# Altium footprint library ESKDPcbLib.PcbLib: 608 footprints (part 33 of 38)
Each footprint in its own frame and in the unit in brackets; x right, y up, seen from the top. Pads: shape width x height; smd on the part's side, far side on the other; paste and mask are expansions set on the pad; w line width, h text height; cw(c..) or ccw(c..) is an arc to the next point about the centre after c.
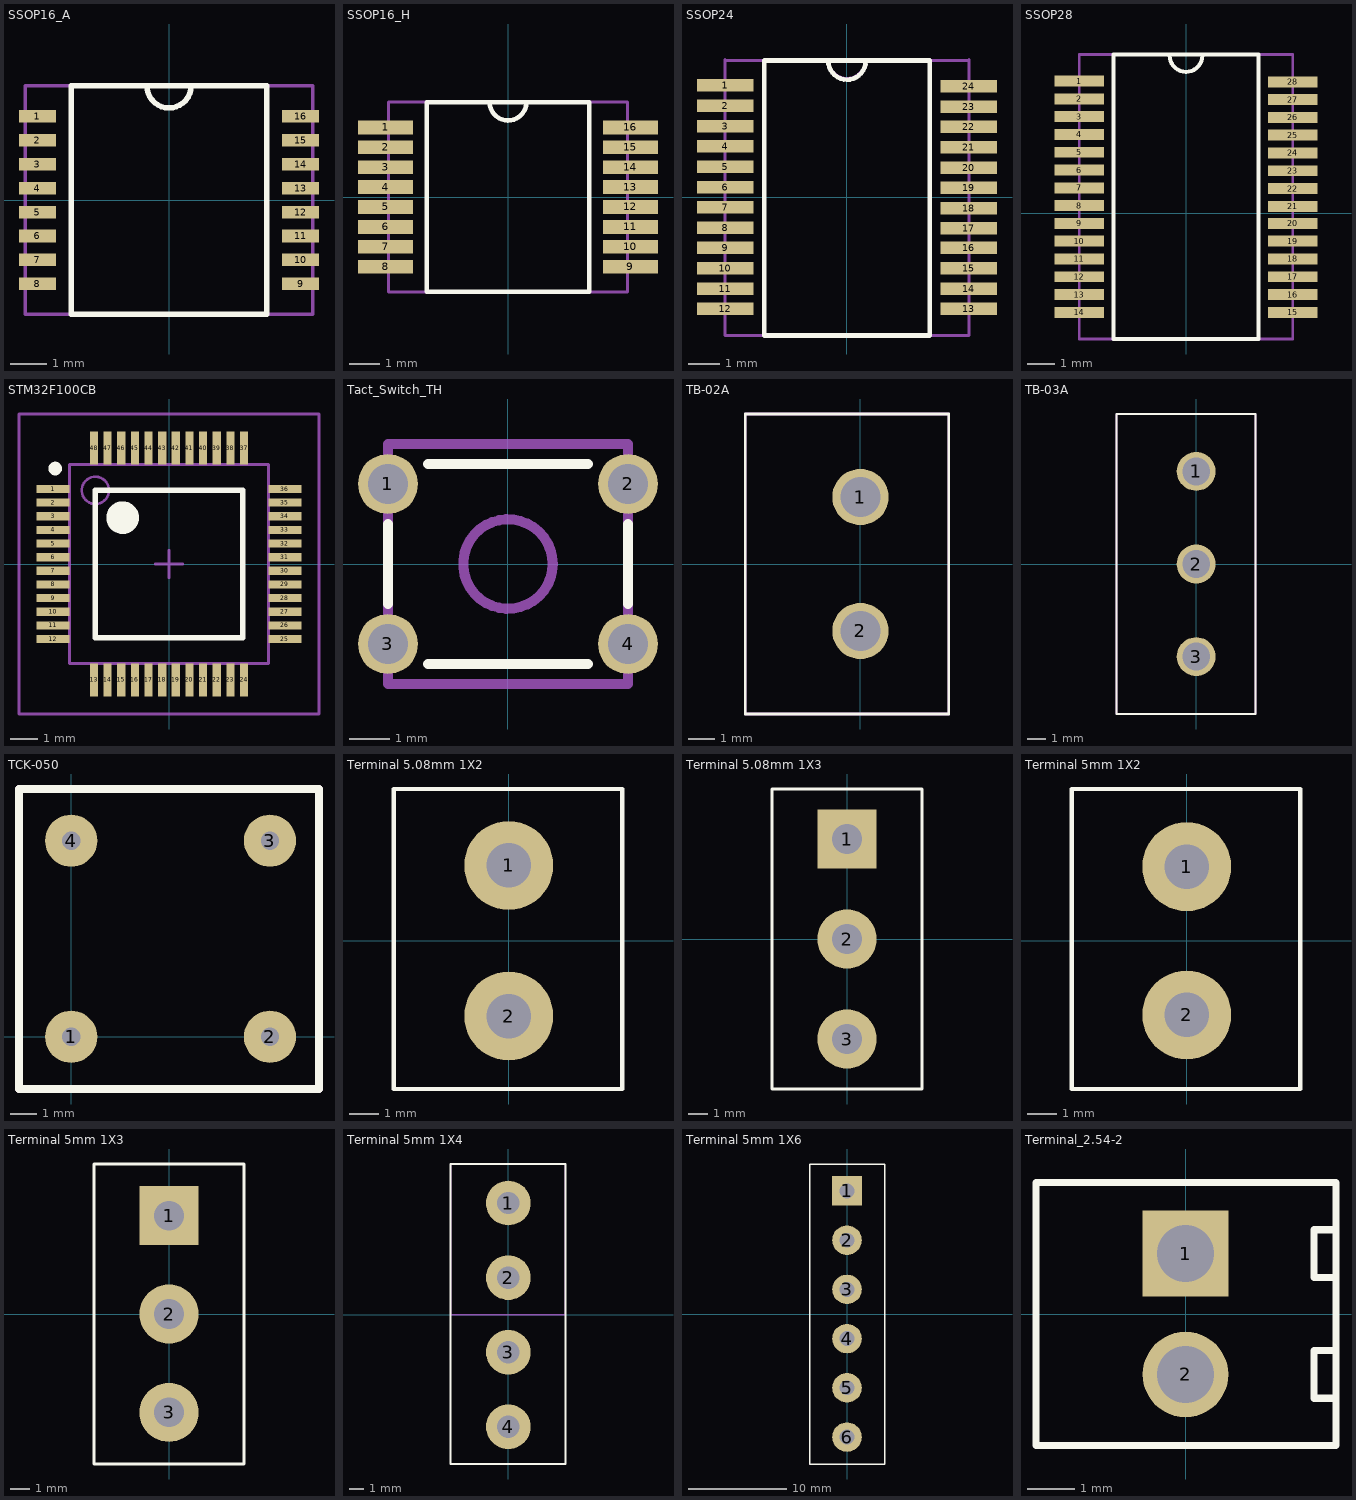
[diagram p32: the footprints below, top view; thin cyan lines are the x and y axes]

## SSOP16_A [mm]
height 1.99
pads (16):
  rect 1x0.34 smd: 1(-3.57,2.275) 2(-3.57,1.625) 3(-3.57,0.975) 4(-3.57,0.325) 5(-3.57,-0.325) 6(-3.57,-0.975) 7(-3.57,-1.625) 8(-3.57,-2.275) 9(3.57,-2.275) 10(3.57,-1.625) 11(3.57,-0.975) 12(3.57,-0.325) 13(3.57,0.325) 14(3.57,0.975) 15(3.57,1.625) 16(3.57,2.275)
Top Overlay:
  lines w0.15: -0.6,3.1 ccw(c0,3.1) 0.6,3.09 ; -2.65,-3.1 2.65,-3.1 2.65,3.1 -2.65,3.1 -2.65,-3.1
Mechanical 7:
  lines w0.1: -2.65,-3.1 -2.65,3.1 ; -0.6,3.1 ccw(c0,3.1) 0.6,3.09 ; 2.65,-3.1 2.65,3.1 ; -3.9,-3.1 -3.9,3.1 3.9,3.1 3.9,-3.1 -3.9,-3.1
Mechanical 10:
  text ".Comment" at -1.02,-3.71 h0.6
  text ".Designator" at -1.23,3.46 h0.8
3D body: height 0.75, standoff 0, extent 2.65,-3.1 3.9,3.1
3D body: height 0.75, standoff 0, extent -3.9,-3.1 -2.65,3.1
3D body: height 1.99, standoff 0, extent -2.65,-3.1 2.65,3.1

## SSOP16_H [mm]
height 1.99
pads (16):
  rect 1.8x0.45 smd: 1(-4,2.275) 2(-4,1.625) 3(-4,0.975) 4(-4,0.325) 5(-4,-0.325) 6(-4,-0.975) 7(-4,-1.625) 8(-4,-2.275) 9(4,-2.275) 10(4,-1.625) 11(4,-0.975) 12(4,-0.325) 13(4,0.325) 14(4,0.975) 15(4,1.625) 16(4,2.275)
Top Overlay:
  lines w0.15: -0.6,3.1 ccw(c0,3.1) 0.6,3.09 ; -2.65,-3.1 2.65,-3.1 2.65,3.1 -2.65,3.1 -2.65,-3.1
Mechanical 7:
  lines w0.1: -2.65,-3.1 -2.65,3.1 ; -0.6,3.1 ccw(c0,3.1) 0.6,3.09 ; 2.65,-3.1 2.65,3.1 ; -3.9,-3.1 3.9,-3.1 3.9,3.1 -3.9,3.1 -3.9,-3.1
Mechanical 10:
  text ".Comment" at -0.67,-3.72 h0.6
  text ".Designator" at -1.23,3.46 h0.8
3D body: height 0.75, standoff 0, extent 2.65,-3.1 3.9,3.1
3D body: height 0.75, standoff 0, extent -3.9,-3.1 -2.65,3.1
3D body: height 1.99, standoff 0, extent -2.65,-3.1 2.65,3.1

## SSOP24 [mm]
height 1.85
pads (24):
  rect 1.8x0.4 smd: 1(-3.9,3.575) 2(-3.9,2.925) 3(-3.9,2.275) 4(-3.9,1.625) 5(-3.9,0.975) 6(-3.9,0.325) 7(-3.9,-0.325) 8(-3.9,-0.975) 9(-3.9,-1.625) 10(-3.9,-2.275) 11(-3.9,-2.925) 12(-3.9,-3.575) 13(3.9,-3.575) 14(3.9,-2.925) 15(3.9,-2.275) 16(3.9,-1.625) 17(3.9,-1) 18(3.9,-0.35) 19(3.9,0.3) 20(3.9,0.95) 21(3.9,1.6) 22(3.9,2.25) 23(3.9,2.9) 24(3.9,3.55)
Top Overlay:
  lines w0.15: -0.6,4.36 ccw(c0,4.36) 0.6,4.35 ; -2.65,-4.425 2.65,-4.425 2.65,4.375 -2.65,4.375 -2.65,-4.425
Mechanical 7:
  lines w0.1: -3.9,4.375 3.9,4.375 ; -3.9,4.4 -3.9,-4.425 3.9,-4.425 3.9,4.4 ; -2.65,-1.8 -2.65,4.35 ; -0.6,4.4 ccw(c0,4.4) 0.6,4.39 ; 2.65,-1.8 2.65,4.4
Mechanical 10:
  text ".Comment" at -0.95,-5.05 h0.6
  text ".Designator" at -1.5,4.725 h0.8
3D body: height 0.75, standoff 0, extent 2.65,-4.425 3.9,4.4
3D body: height 0.75, standoff 0, extent -3.9,-4.425 -2.65,4.4
3D body: height 1.99, standoff 0, extent -2.65,-4.425 2.65,4.45

## SSOP28 [mm]
height 1.85
pads (28):
  rect 1.8x0.4 smd: 1(-3.9,4.825) 2(-3.9,4.175) 3(-3.9,3.525) 4(-3.9,2.875) 5(-3.9,2.225) 6(-3.9,1.575) 7(-3.9,0.925) 8(-3.9,0.275) 9(-3.9,-0.375) 10(-3.9,-1.025) 11(-3.9,-1.675) 12(-3.9,-2.325) 13(-3.9,-2.975) 14(-3.9,-3.625) 15(3.9,-3.625) 16(3.9,-2.975) 17(3.9,-2.325) 18(3.9,-1.675) 19(3.9,-1.025) 20(3.9,-0.375) 21(3.9,0.25) 22(3.9,0.9) 23(3.9,1.55) 24(3.9,2.2) 25(3.9,2.85) 26(3.9,3.5) 27(3.9,4.15) 28(3.9,4.8)
Top Overlay:
  lines w0.15: -0.6,5.765 ccw(c0,5.765) 0.6,5.756 ; -2.65,-4.6 -2.65,5.8 2.65,5.8 2.65,-4.6 -2.65,-4.6
Mechanical 7:
  lines w0.1: -2.65,-0.55 -2.65,5.6 ; -0.6,5.765 ccw(c0,5.765) 0.6,5.756 ; 2.65,-0.55 2.65,5.65 ; -3.9,-4.6 -3.9,5.8 3.9,5.8 3.9,-4.6 -3.9,-4.6
Mechanical 10:
  text ".Designator" at -1.5,5.975 h0.8
  text ".Comment" at -0.8,-5 h0.6
3D body "SSOP-28-1.STEP": height 2.15, standoff 0, extent -3.878,-4.565 3.878,5.765

## STM32F100CB [mm] "TSQFP, 48-Leads, Body 9,7x9,7mm (max), Pitch 0,50mm, IPC Medium Density"
height 1.6
pads (48):
  rect 1.2x0.3 smd: 1(-4.25,2.75) 2(-4.25,2.25) 3(-4.25,1.75) 4(-4.25,1.25) 5(-4.25,0.75) 6(-4.25,0.25) 7(-4.25,-0.25) 8(-4.25,-0.75) 9(-4.25,-1.25) 10(-4.25,-1.75) 11(-4.25,-2.25) 12(-4.25,-2.75) 25(4.25,-2.75) 26(4.25,-2.25) 27(4.25,-1.75) 28(4.25,-1.25) 29(4.25,-0.75) 30(4.25,-0.25) 31(4.25,0.25) 32(4.25,0.75) 33(4.25,1.25) 34(4.25,1.75) 35(4.25,2.25) 36(4.25,2.75)
  rect 0.3x1.2 smd: 13(-2.75,-4.25) 14(-2.25,-4.25) 15(-1.75,-4.25) 16(-1.25,-4.25) 17(-0.75,-4.25) 18(-0.25,-4.25) 19(0.25,-4.25) 20(0.75,-4.25) 21(1.25,-4.25) 22(1.75,-4.25) 23(2.25,-4.25) 24(2.75,-4.25) 37(2.75,4.25) 38(2.25,4.25) 39(1.75,4.25) 40(1.25,4.25) 41(0.75,4.25) 42(0.25,4.25) 43(-0.25,4.25) 44(-0.75,4.25) 45(-1.25,4.25) 46(-1.75,4.25) 47(-2.25,4.25) 48(-2.75,4.25)
Top Overlay:
  circle w0.6: c-1.7,1.7 r0.3
  circle w0.25: c-4.175,3.5 r0.125
  lines w0.2: -2.7,-2.7 2.7,-2.7 2.7,2.7 -2.7,2.7 -2.7,-2.7
Mechanical 13:
  circle w0.1: c-2.7,2.7 r0.5
  lines w0.1: -3.65,-3.65 3.65,-3.65 3.65,3.65 -3.65,3.65 -3.65,-3.65
Mechanical 15:
  lines w0.1: -0.5,0 0.5,0 ; 0,-0.5 0,0.5 ; -5.5,-5.5 5.5,-5.5 5.5,5.5 -5.5,5.5 -5.5,-5.5
3D body: height 1.6, standoff 0.05, extent -3.65,-3.65 3.65,3.65

## Tact_Switch_TH [mm]
height 5
pads (4):
  round 1.5 hole 1 mask+0.075: 1(-3,2) 2(3,2) 3(-3,-2) 4(3,-2)
Top Overlay:
  lines w0.254: -3,-1 -3,1 ; -2,-2.5 2,-2.5 ; -2,2.5 2,2.5 ; 3,-1 3,1
Mechanical 9:
  circle w0.254: c0,0 r1.118
  lines w0.254: -3,-3 3,-3 3,3 -3,3 -3,-3
3D body: height 4, standoff 0, extent -1.118,-1.118 1.118,1.118
3D body: height 3.5, standoff 0.05, extent -3,-3 3,3

## TB-02A [mm]
pads (2):
  round 2.1 hole 1.5: 1(0,2.5) 2(0,-2.5)
Top Overlay:
  lines w0.1: -4.3,-5.6 -4.3,5.6 3.3,5.6 3.3,-5.6 -4.3,-5.6
Mechanical 7:
  lines w0.1: -4.3,-5.6 -4.3,5.6 3.3,5.6 3.3,-5.6 -4.3,-5.6
3D body: height 10, standoff -3.5, extent -4.25,-5.58 3.25,5.58

## TB-03A [mm]
pads (3):
  round 2.1 hole 1.5: 1(0,5) 2(0,0) 3(0,-5)
Top Overlay:
  lines w0.1: -4.3,-8.1 -4.3,8.1 3.2,8.1 3.2,-8.1 -4.3,-8.1
Mechanical 7:
  lines w0.1: -4.3,-8.1 -4.3,8.1 3.2,8.1 3.2,-8.1 -4.3,-8.1
3D body: height 10, standoff -3.5, extent -4.3,-8.08 3.2,8.08

## TCK-050 [mm]
pads (4):
  round 2 hole 0.7: 1(0,0) 2(7.62,0) 3(7.62,7.52) 4(0,7.52)
Top Overlay:
  lines w0.3: -2,-2 9.5,-2 9.5,9.5 -2,9.5 -2,-2
Mechanical 7:
  lines w0.3: -2,-2 9.5,-2 9.5,9.5 -2,9.5 -2,-2
Mechanical 10:
  text ".Designator" at 6.5,11 h0.8
  text ".Comment" at 6.5,10 h0.6
3D body: height 8.8, standoff 0, extent -2,-2 9.5,9.5

## Terminal 5.08mm 1X2 [mm]
pads (2):
  round 3 hole 1.5: 1(0,2.54) 2(0,-2.54)
Top Overlay:
  lines w0.15: -3.875,-5 -3.875,5.12 3.825,5.12 3.825,-5 -3.875,-5
Mechanical 7:
  lines w0.1: -3.85,-5 -3.85,5.12 3.825,5.12 3.825,-5 -3.85,-5
Mechanical 10:
  text ".Designator" at -0.725,5.95 h1.52
  text ".Comment" at -0.725,7.175 h1.52
3D body "terminal_1X2.STEP": height 10, standoff -2.28, extent -3.875,-5.38 3.825,5.12

## Terminal 5.08mm 1X3 [mm]
pads (3):
  rect 3x3 hole 1.5: 1(0,5.08)
  round 3 hole 1.5: 2(0,0) 3(0,-5.08)
Top Overlay:
  lines w0.15: -3.81,-7.62 -3.81,7.62 3.81,7.62 3.81,-7.62 -3.81,-7.62
Mechanical 7:
  lines w0.1: -3.81,-7.62 -3.81,7.62 3.81,7.62 3.81,-7.62 -3.81,-7.62
Mechanical 10:
  text ".Comment" at -3.225,9.675 h1.52
  text ".Designator" at -3.225,8.45 h1.52
3D body "terminal_blocks_a-tb508-tc03.stp": height 9.95, standoff -3.4, extent -3.81,-8.22 3.69,8.18

## Terminal 5mm 1X2 [mm]
pads (2):
  round 3 hole 1.5: 1(0,2.5) 2(0,-2.5)
Top Overlay:
  lines w0.15: -3.875,-5 3.825,-5 3.825,5.12 -3.875,5.12 -3.875,-5
Mechanical 7:
  lines w0.1: -3.85,-5 3.825,-5 3.825,5.12 -3.85,5.12 -3.85,-5
Mechanical 10:
  text ".Comment" at -0.725,7.175 h1.52
  text ".Designator" at -0.725,5.95 h1.52
3D body "terminal_1X2.STEP": height 10, standoff -2.28, extent -3.875,-5.38 3.825,5.12

## Terminal 5mm 1X3 [mm]
pads (3):
  rect 3x3 hole 1.5: 1(0,5)
  round 3 hole 1.5: 2(0,0) 3(0,-5)
Top Overlay:
  lines w0.15: -3.81,-7.62 -3.81,7.62 3.81,7.62 3.81,-7.62 -3.81,-7.62
Mechanical 7:
  lines w0.1: -3.81,-7.62 -3.81,7.62 3.81,7.62 3.81,-7.62 -3.81,-7.62
Mechanical 10:
  text ".Comment" at -3.225,9.675 h1.52
  text ".Designator" at -3.225,8.45 h1.52
3D body "terminal_blocks_a-tb508-tc03.stp": height 9.95, standoff -3.4, extent -3.81,-8.22 3.69,8.18

## Terminal 5mm 1X4 [mm]
pads (4):
  round 3 hole 1.5: 1(0,7.5) 2(0,2.5) 3(0,-2.5) 4(0,-7.5)
Top Overlay:
  lines w0.15: -3.875,-10 3.825,-10 3.825,10.12 -3.875,10.12 -3.875,-10
Mechanical 7:
  lines w0.1: -3.85,0 3.825,0 3.825,10.12 -3.85,10.12 -3.85,0
Mechanical 10:
  text ".Comment" at -0.725,12.175 h1.52
  text ".Designator" at -0.725,10.95 h1.52
3D body "terminal_1X2.STEP": height 10, standoff -2.28, extent -3.85,0 3.85,10.5
3D body "terminal_1X2.STEP": height 10, standoff -2.28, extent -3.85,-10 3.85,0.5

## Terminal 5mm 1X6 [mm]
pads (6):
  rect 3x3 hole 1.5: 1(0,12.5)
  round 3 hole 1.5: 2(0,7.5) 3(0,2.5) 4(0,-2.5) 5(0,-7.5) 6(0,-12.5)
Top Overlay:
  lines w0.15: -3.81,-15.24 -3.81,15.24 3.81,15.24 3.81,-15.24 -3.81,-15.24
Mechanical 7:
  lines w0.1: -3.81,-15.24 -3.81,15.24 3.81,15.24 3.81,-15.24 -3.81,-15.24
Mechanical 10:
  text ".Designator" at 4.275,15.95 h1.52
  text ".Comment" at 4.275,17.175 h1.52
3D body "terminal_blocks_a-tb508-tc03.stp": height 9.95, standoff -3.4, extent -3.81,-0.6 3.69,15.8
3D body "terminal_blocks_a-tb508-tc03.stp": height 9.95, standoff -3.4, extent -3.81,-15.84 3.69,0.56

## Terminal_2.54-2 [mm]
height 8.5
pads (2):
  rect 1.8x1.8 hole 1.2: 1(0,1.27)
  round 1.8 hole 1.2: 2(0,-1.27)
Top Overlay:
  lines w0.15: 3.16,-1.77 2.7,-1.77 2.7,-0.77 3.16,-0.77 ; 3.16,0.77 2.7,0.77 2.7,1.77 3.16,1.77 ; -3.14,-2.765 -3.14,2.765 3.16,2.765 3.16,-2.765 -3.14,-2.765
Mechanical 7:
  lines w0.1: 3.16,-1.77 2.7,-1.77 2.7,-0.77 3.16,-0.77 ; 3.16,0.77 2.7,0.77 2.7,1.77 3.16,1.77 ; -3.14,-2.765 3.16,-2.765 3.16,2.765 -3.14,2.765 -3.14,-2.765
Mechanical 10:
  text ".Comment" at -1.15,3.275 h0.6
  text ".Designator" at -1.175,3.975 h0.8
3D body: height 8.5, standoff 0, extent -3.14,-2.765 3.16,2.765